# Altium footprint library JDR2812（公开）.PcbLib: 142 footprints (part 9 of 9)
Each footprint in its own frame and in the unit in brackets; x right, y up, seen from the top. Pads: shape width x height; smd on the part's side, far side on the other; paste and mask are expansions set on the pad; w line width, h text height; cw(c..) or ccw(c..) is an arc to the next point about the centre after c.
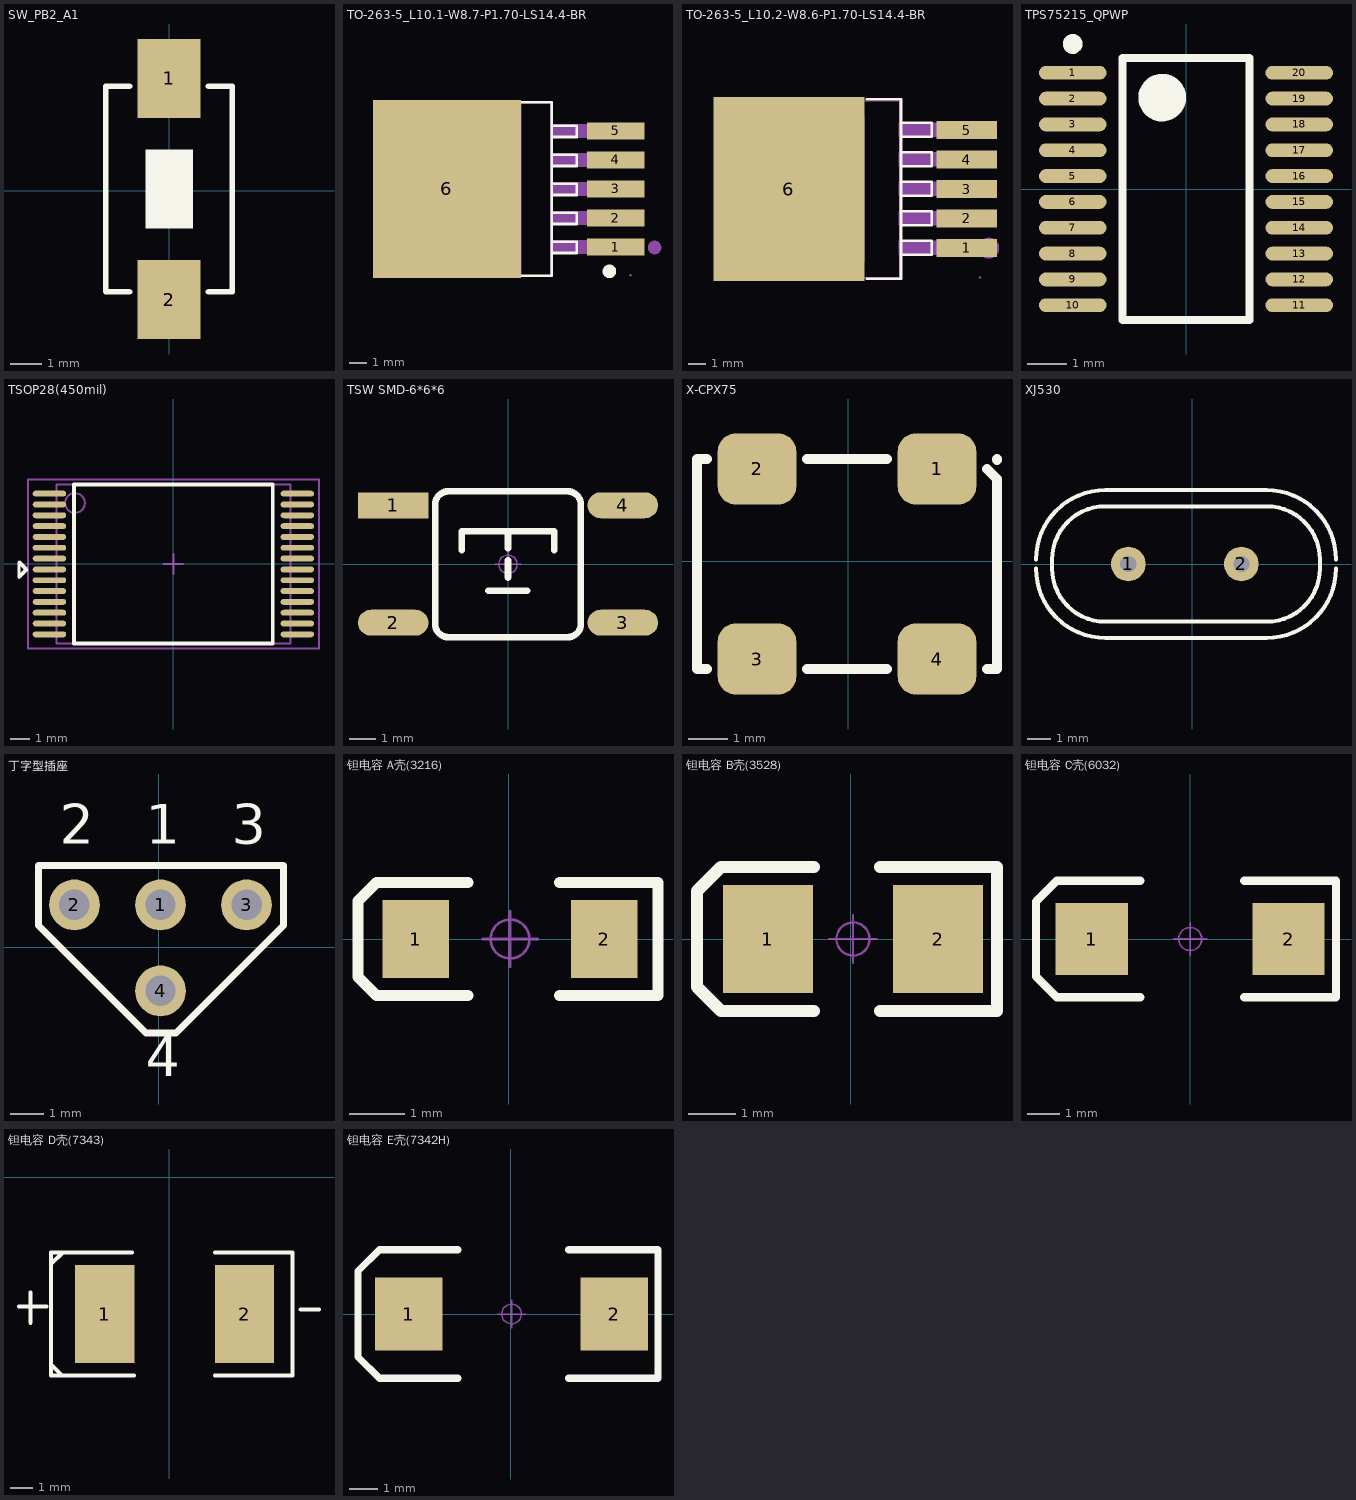
[diagram p8: the footprints below, top view; thin cyan lines are the x and y axes]

## SW_PB2_A1 [mm]
height 4.65
pads (2):
  rect 2x2.5 smd: 1(0,3.556) 2(0,-3.444)
Top Overlay:
  region: -0.747,1.309 -0.747,-1.191 0.753,-1.191 0.753,1.309
  lines w0.178: -1.25,-3.194 -2,-3.19 -2,3.306 -1.25,3.306 ; 1.25,-3.194 2,-3.194 2,3.306 1.25,3.306
3D body: height 0.8, standoff 0, extent -2.032,-3.175 2.032,3.302
3D body: height 1.2, standoff 0.8, extent -0.762,-1.143 0.762,1.27

## TO-263-5_L10.1-W8.7-P1.70-LS14.4-BR [mm]
pads (6):
  rect 3.359x1.02 smd: 1(-1179.553,-1191.984) 2(-1179.553,-1190.284) 3(-1179.553,-1188.584) 4(-1179.553,-1186.884) 5(-1179.553,-1185.184)
  rect 8.7x10.431 smd: 6(-1189.45,-1188.584)
Top Overlay:
  circle w0.4: c-1179.93,-1193.41 r0.2
  lines w0.152: -1185.382,-1193.676 -1183.309,-1193.676 -1183.309,-1183.493 -1185.382,-1183.493 ; -1183.309,-1192.336 -1181.835,-1192.336 -1181.835,-1191.668 -1183.309,-1191.668 ; -1183.309,-1190.636 -1181.835,-1190.636 -1181.835,-1189.968 -1183.309,-1189.968 ; -1183.309,-1188.936 -1181.835,-1188.936 -1181.835,-1188.268 -1183.309,-1188.268 ; -1183.309,-1187.236 -1181.835,-1187.236 -1181.835,-1186.568 -1183.309,-1186.568 ; -1183.309,-1185.536 -1181.835,-1185.536 -1181.835,-1184.868 -1183.309,-1184.868
Mechanical 6:
  circle w0.4: c-1177.282,-1192.013 r0.2
Mechanical 15:
  region: -1178.623,-1193.634 -1178.642,-1193.588 -1178.688,-1193.569 -1178.734,-1193.588 -1178.753,-1193.634 -1178.734,-1193.68 -1178.688,-1193.699 -1178.642,-1193.68
  region: -1185.085,-1183.534 -1185.085,-1193.634 -1192.052,-1193.634 -1193.055,-1192.596 -1193.055,-1184.572 -1192.052,-1183.534
  region: -1180.638,-1191.579 -1180.638,-1192.389 -1183.395,-1192.389 -1183.395,-1191.579
  region: -1178.688,-1191.579 -1178.688,-1192.389 -1180.728,-1192.389 -1180.728,-1191.579
  region: -1178.688,-1189.879 -1178.688,-1190.689 -1180.728,-1190.689 -1180.728,-1189.879
  region: -1180.638,-1189.879 -1180.638,-1190.689 -1183.395,-1190.689 -1183.395,-1189.879
  region: -1178.688,-1188.179 -1178.688,-1188.989 -1180.728,-1188.989 -1180.728,-1188.179
  region: -1180.638,-1188.179 -1180.638,-1188.989 -1183.395,-1188.989 -1183.395,-1188.179
  region: -1178.688,-1186.479 -1178.688,-1187.289 -1180.728,-1187.289 -1180.728,-1186.479
  region: -1180.638,-1186.479 -1180.638,-1187.289 -1183.395,-1187.289 -1183.395,-1186.479
  region: -1178.688,-1184.779 -1178.688,-1185.589 -1180.728,-1185.589 -1180.728,-1184.779
  region: -1180.638,-1184.779 -1180.638,-1185.589 -1183.395,-1185.589 -1183.395,-1184.779
  lines w0.051: -1192.106,-1193.634 -1183.366,-1193.634 -1183.366,-1183.534 -1192.106,-1183.534 -1192.106,-1193.634

## TO-263-5_L10.2-W8.6-P1.70-LS14.4-BR [mm]
pads (6):
  rect 3.5x1.02 smd: 1(-1179.195,-1191.906) 2(-1179.195,-1190.206) 3(-1179.195,-1188.506) 4(-1179.195,-1186.806) 5(-1179.195,-1185.106)
  rect 8.705x10.587 smd: 6(-1189.447,-1188.506)
Top Overlay:
  lines w0.15: -1182.979,-1192.296 -1181.215,-1192.296 -1181.215,-1191.489 -1182.979,-1191.489 ; -1182.979,-1190.596 -1181.215,-1190.596 -1181.215,-1189.789 -1182.979,-1189.789 ; -1182.979,-1188.896 -1181.215,-1188.896 -1181.215,-1188.089 -1182.979,-1188.089 ; -1182.979,-1187.196 -1181.215,-1187.196 -1181.215,-1186.389 -1182.979,-1186.389 ; -1182.979,-1185.496 -1181.215,-1185.496 -1181.215,-1184.689 -1182.979,-1184.689
  lines w0.152: -1184.943,-1193.673 -1182.979,-1193.673 -1182.979,-1183.34 -1184.943,-1183.34
Mechanical 6:
  circle w0.6: c-1177.921,-1191.916 r0.3
Mechanical 15:
  region: -1178.365,-1193.596 -1178.383,-1193.552 -1178.429,-1193.533 -1178.475,-1193.552 -1178.493,-1193.596 -1178.475,-1193.64 -1178.429,-1193.659 -1178.383,-1193.64 -1178.365,-1193.596
  region: -1178.399,-1191.501 -1178.399,-1192.311 -1180.439,-1192.311 -1180.439,-1191.501
  region: -1178.399,-1189.801 -1178.399,-1190.611 -1180.439,-1190.611 -1180.439,-1189.801
  region: -1178.399,-1188.101 -1178.399,-1188.911 -1180.439,-1188.911 -1180.439,-1188.101
  region: -1178.399,-1186.401 -1178.399,-1187.211 -1180.439,-1187.211 -1180.439,-1186.401
  region: -1178.399,-1184.696 -1178.399,-1185.506 -1180.439,-1185.506 -1180.439,-1184.696
  region: -1185.095,-1184.306 -1185.095,-1192.706 -1191.795,-1192.706 -1191.795,-1193.596 -1192.581,-1193.596 -1193.065,-1192.578 -1193.065,-1184.434 -1192.581,-1183.416 -1191.795,-1183.416 -1191.795,-1184.306
  region: -1180.399,-1184.696 -1180.399,-1185.496 -1183.099,-1185.496 -1183.099,-1184.696
  region: -1180.399,-1186.396 -1180.399,-1187.196 -1183.099,-1187.196 -1183.099,-1186.396
  region: -1180.399,-1188.096 -1180.399,-1188.896 -1183.099,-1188.896 -1183.099,-1188.096
  region: -1180.399,-1189.796 -1180.399,-1190.596 -1183.099,-1190.596 -1183.099,-1189.796
  region: -1180.399,-1191.496 -1180.399,-1192.296 -1183.099,-1192.296 -1183.099,-1191.496
  lines w0.051: -1191.795,-1193.596 -1183.055,-1193.596 -1183.055,-1183.416 -1191.795,-1183.416 -1191.795,-1193.596

## TPS75215_QPWP [mm]
height 2.65
pads (20):
  oval 1.7x0.35 smd: 1(-2.85,2.925) 2(-2.85,2.275) 3(-2.85,1.625) 4(-2.85,0.975) 5(-2.85,0.325) 6(-2.85,-0.325) 7(-2.85,-0.975) 8(-2.85,-1.625) 9(-2.85,-2.275) 10(-2.85,-2.925) 11(2.85,-2.925) 12(2.85,-2.275) 13(2.85,-1.625) 14(2.85,-0.975) 15(2.85,-0.325) 16(2.85,0.325) 17(2.85,0.975) 18(2.85,1.625) 19(2.85,2.275) 20(2.85,2.925)
Top Overlay:
  circle w0.25: c-2.85,3.65 r0.125
  circle w0.6: c-0.6,2.3 r0.3
  lines w0.2: -1.6,-3.3 -1.6,3.3 1.6,3.3 1.6,-3.3 -1.6,-3.3

## TSOP28(450mil) [mm]
height 2.65
pads (28):
  oval 1.7x0.3 smd: 1(-6.3,-0.275) 2(-6.3,-0.825) 3(-6.3,-1.375) 4(-6.3,-1.925) 5(-6.3,-2.475) 6(-6.3,-3.025) 7(-6.3,-3.575) 8(6.3,-3.575) 9(6.3,-3.025) 10(6.3,-2.475) 11(6.3,-1.925) 12(6.3,-1.375) 13(6.3,-0.825) 14(6.3,-0.275) 15(6.3,0.275) 16(6.3,0.825) 17(6.3,1.375) 18(6.3,1.925) 19(6.3,2.475) 20(6.3,3.025) 21(6.3,3.575) 22(-6.3,3.575) 23(-6.3,3.025) 24(-6.3,2.475) 25(-6.3,1.925) 26(-6.3,1.375) 27(-6.3,0.825) 28(-6.3,0.275)
Top Overlay:
  lines w0.178: -7.847,-0.154 -7.847,0.1 -7.466,-0.281 -7.847,-0.662 -7.847,-0.535 -7.847,-0.027
  lines w0.2: -5.05,-4.05 5.05,-4.05 5.05,4.05 -5.05,4.05 -5.05,-4.05
Mechanical 13:
  circle w0.1: c-5,3.1 r0.5
  lines w0.1: -5.95,-4.05 5.95,-4.05 5.95,4.05 -5.95,4.05 -5.95,-4.05
Mechanical 15:
  lines w0.1: -0.5,0 0.5,0 ; 0,-0.5 0,0.5 ; -7.4,-4.3 7.4,-4.3 7.4,4.3 -7.4,4.3 -7.4,-4.3
3D body: height 2.65, standoff 0.1, extent -5.95,-4.05 5.95,4.05

## TSW SMD-6*6*6 [mm] "6*6*6mm"
pads (4):
  rect 2.7x1 smd: 1(-4.4,2.261)
  oval 2.7x1 smd: 2(-4.4,-2.239) 3(4.4,-2.239) 4(4.4,2.261)
Top Overlay:
  lines w0.254: -1.778,0.533 -1.778,1.27 1.778,1.27 1.778,0.533 ; -0.762,-1.016 0.737,-1.016 ; 0,-0.508 0,0.152 ; 0,0.61 0,1.27 ; -2.794,-2.286 ccw(c-2.286,-2.286) -2.286,-2.794 2.286,-2.794 ccw(c2.286,-2.286) 2.794,-2.286 2.794,2.286 ccw(c2.286,2.286) 2.286,2.794 -2.286,2.794 ccw(c-2.286,2.286) -2.794,2.286 -2.794,-2.286
Mechanical 15:
  circle w0.05: c0,0 r0.35
  lines w0.05: -0.5,0 0.5,0 ; 0,-0.5 0,0.5
3D body "TSW SMD-6x6x6.STEP": height 5.95, standoff -0.03, extent -4.5,-3 4.5,3

## X-CPX75 [mm]
pads (4):
  rrect50% 2x1.8 smd: 1(2.256,2.339) 2(-2.316,2.339) 3(-2.316,-2.487) 4(2.256,-2.487)
Top Overlay:
  lines w0.254: -3.586,-2.741 -3.84,-2.741 -3.84,2.593 -3.586,2.593 ; -1.046,-2.741 0.986,-2.741 ; -1.046,2.593 0.986,2.593 ; 3.526,-2.741 3.78,-2.741 3.78,2.085 3.526,2.339 ; 3.78,2.568 3.78,2.593

## XJ530 [mm]
pads (2):
  round 1.5 hole 0.7: 1(-2.769,0) 2(2.131,0)
Top Overlay:
  lines w0.178: -6.769,-0.2 ccw(c-3.769,-0.2) -3.769,-3.2 3.231,-3.2 ccw(c3.231,-0.2) 6.231,-0.2 ; -6.769,0.2 cw(c-3.769,0.2) -3.769,3.2 3.231,3.2 cw(c3.231,0.2) 6.231,0.2 ; -6.069,-0.2 ccw(c-3.769,-0.2) -3.769,-2.5 3.231,-2.5 ccw(c3.231,-0.2) 5.531,-0.2 5.531,0.2 ccw(c3.231,0.2) 3.231,2.5 -3.769,2.5 ccw(c-3.769,0.2) -6.069,0.2 -6.069,-0.2

## 丁字型插座 [mm]
pads (4):
  round 1.5 hole 0.9: 1(0.051,1.245) 2(-2.489,1.245) 3(2.591,1.245) 4(0.051,-1.295)
Top Overlay:
  lines w0.203: -3.556,0.635 -0.381,-2.54 0.508,-2.54 3.683,0.635 3.683,2.413 -3.556,2.413 -3.556,0.635
  text "4" at -0.381,-4.191 h2
  text "3" at 2.159,2.667 h2
  text "2" at -2.921,2.667 h2
  text "1" at -0.381,2.667 h2

## 钽电容 A壳(3216) [mm]
pads (2):
  rect 1.2x1.4 smd: 1(-1.675,0) 2(1.725,0)
Top Overlay:
  lines w0.2: -0.737,-1.016 -2.388,-1.016 -2.718,-0.686 -2.718,0.686 -2.388,1.016 -0.737,1.016 ; 0.914,-1.016 2.692,-1.016 2.692,1.016 0.914,1.016
Mechanical 15:
  circle w0.05: c0.025,0 r0.35
  lines w0.05: -0.475,0 0.525,0 ; 0.025,-0.5 0.025,0.5
3D body "CD A(3216).STEP": height 1.6, standoff -0.01, extent -1.575,-0.8 1.626,0.8

## 钽电容 B壳(3528) [mil]
pads (2):
  rect 75x90 smd: 1(-68.87,-0.01) 2(72.86,-0.01)
Top Overlay:
  lines w10: -30.51,-60 -108,-60 -128,-40 -128,40 -108,60 -30.51,60 ; 24.49,-60 122,-60 122,60 24.49,60
Mechanical 15:
  circle w1.97: c2,0 r13.78
  lines w1.97: -17.68,0 21.68,0 ; 2,-19.68 2,19.68
3D body "CD B(3528).STEP": height 74.84, standoff -0.3, extent -66.92,-55.12 70.91,55.11

## 钽电容 C壳(6032) [mm]
pads (2):
  rect 2.2x2.2 smd: 1(-3,0) 2(3,0)
Top Overlay:
  lines w0.254: -1.524,-1.778 -4.064,-1.778 -4.699,-1.143 -4.699,1.143 -4.064,1.778 -1.524,1.778 ; 1.651,-1.778 4.445,-1.778 4.445,1.778 1.651,1.778
Mechanical 15:
  circle w0.05: c0,0 r0.35
  lines w0.05: -0.5,0 0.5,0 ; 0,-0.5 0,0.5
3D body "CD C(6032).STEP": height 2.5, standoff -0.01, extent -3,-1.6 3,1.6

## 钽电容 D壳(7343) [mm]
pads (2):
  rect 2.6x4.3 smd: 1(-2.834,-6.004) 2(3.301,-6.004)
Top Overlay:
  lines w0.178: -6.593,-5.674 -5.393,-5.674 ; -6.085,-6.385 -6.085,-5.065 ; -5.182,-8.103 -5.182,-8.22 -4.699,-8.703 ; -5.182,-3.81 -4.674,-3.303 -4.547,-3.303 ; -1.628,-3.303 -5.182,-3.303 -5.182,-8.703 -1.542,-8.703 ; 1.997,-8.702 5.41,-8.702 5.41,-3.302 2.007,-3.302 ; 5.764,-5.801 6.564,-5.801

## 钽电容 E壳(7342H) [mm]
pads (2):
  rect 2.4x2.6 smd: 1(-3.625,0) 2(3.675,0)
Top Overlay:
  lines w0.254: -1.88,-2.286 -4.674,-2.286 -5.436,-1.524 -5.436,1.524 -4.674,2.286 -1.88,2.286 ; 2.057,-2.286 5.232,-2.286 5.232,2.286 2.057,2.286
Mechanical 15:
  circle w0.05: c0.025,0 r0.35
  lines w0.05: -0.475,0 0.525,0 ; 0.025,-0.5 0.025,0.5
3D body "CD E(7343H).STEP": height 4, standoff -0.01, extent -3.625,-2.15 3.676,2.15